# Altium footprint library Passive Pad Lib.PcbLib: 110 footprints (part 5 of 7)
Each footprint in its own frame and in the unit in brackets; x right, y up, seen from the top. Pads: shape width x height; smd on the part's side, far side on the other; paste and mask are expansions set on the pad; w line width, h text height; cw(c..) or ccw(c..) is an arc to the next point about the centre after c.
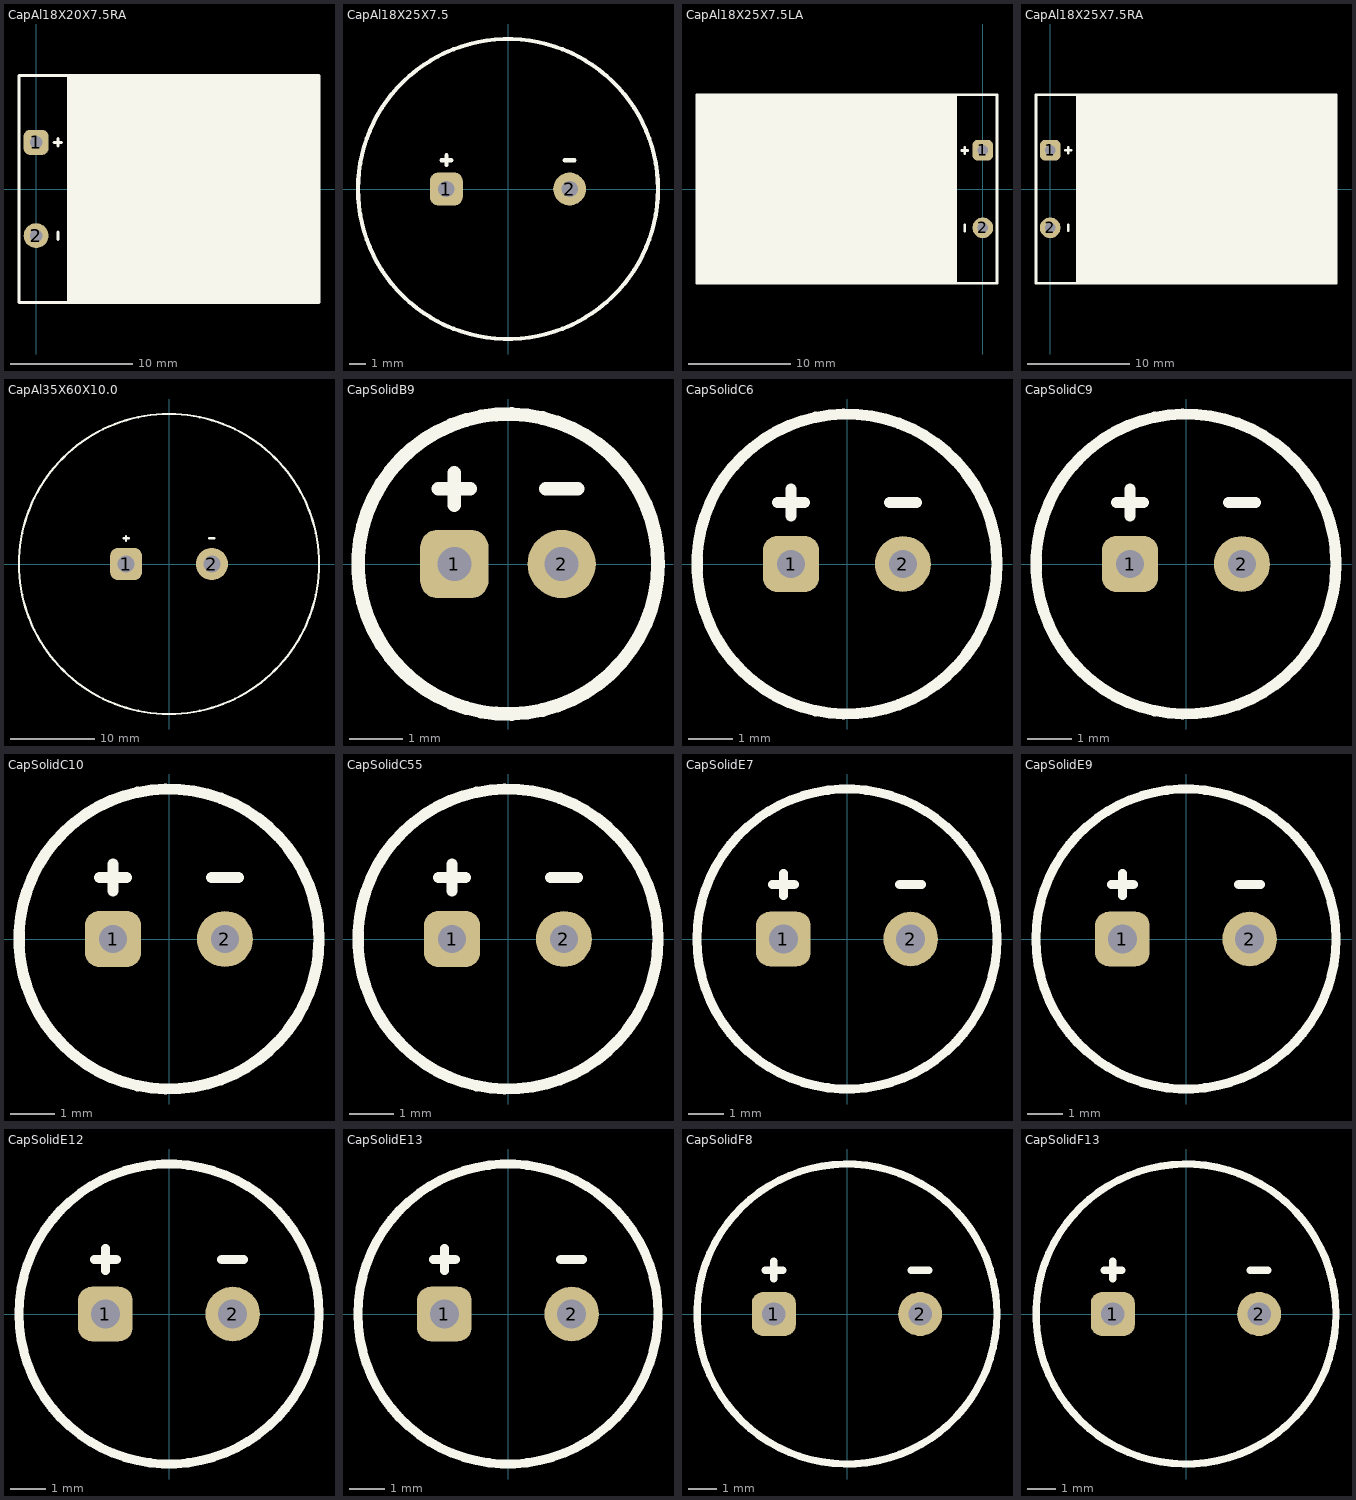
[diagram p4: the footprints below, top view; thin cyan lines are the x and y axes]

## CapAl18X20X7.5RA [mil] "Aluminum Electrolytic Capacitors (Size:18X20X7.5mm, Angled Right)"
pads (2):
  rrect50% 80x80 hole 40: 1(0,150)
  round 80 hole 40: 2(0,-150)
Top Overlay:
  region: 100,365 100,-365 910,-365 910,365
  lines w10: 58,150 82,150 ; 70,-162 70,-138 ; 70,138 70,162 ; -55,-365 -55,365 910,365 910,-365 -55,-365
3D body "THD Capacitor Polar 18x20x7.5mm RA.step": height 715.33, standoff -112.44, extent -16.09,-355.33 906.09,355.33

## CapAl18X25X7.5 [mil] "Aluminum Electrolytic Capacitors (Size:18X25X7.5mm,Straight)"
pads (2):
  rrect50% 80x80 hole 40: 1(-150,0)
  round 80 hole 40: 2(150,0)
Top Overlay:
  circle w10: c0,0 r365
  lines w10: -162,70 -138,70 ; -150,58 -150,82 ; 138,70 162,70
3D body "THD Capacitor Polar 18x25x7.5mm.step": height 999.94, standoff -133.81, extent -355.33,-355.33 355.33,355.33

## CapAl18X25X7.5LA [mil] "Aluminum Electrolytic Capacitors (Size:18X25X7.5mm, Angled Left)"
pads (2):
  rrect50% 80x80 hole 40: 1(0,150)
  round 80 hole 40: 2(0,-150)
Top Overlay:
  region: -100,-365 -100,365 -1105,365 -1105,-365
  lines w10: -82,149 -58,149 ; -70,-163 -70,-139 ; -70,137 -70,161 ; -1105,-365 -1105,365 55,365 55,-365 -1105,-365
3D body "THD Capacitor Polar 18x25x7.5mm LA.step": height 715.33, standoff -112.44, extent -1102.93,-355.33 16.26,355.33

## CapAl18X25X7.5RA [mil] "Aluminum Electrolytic Capacitors (Size:18X25X7.5mm, Angled Right)"
pads (2):
  rrect50% 80x80 hole 40: 1(0,150)
  round 80 hole 40: 2(0,-150)
Top Overlay:
  region: 100,365 100,-365 1105,-365 1105,365
  lines w10: 58,150 82,150 ; 70,-162 70,-138 ; 70,138 70,162 ; -55,-365 1105,-365 1105,365 -55,365 -55,-365
3D body "THD Capacitor Polar 18x25x7.5mm RA.step": height 720.33, standoff -107.44, extent -16.09,-355.33 1102.94,355.33

## CapAl35X60X10.0 [mil] "Aluminum Electrolytic Capacitors (Size:35X60X10mm,Straight)"
pads (2):
  rrect50% 150x150 hole 80: 1(-200,0)
  round 150 hole 80: 2(200,0)
Top Overlay:
  circle w10: c0,0 r700
  lines w10: -212,120 -188,120 ; -200,108 -200,130 ; 188,120 212,120
3D body "THD Capacitor Polar 35x60x10mm.step": height 2421.26, standoff -196.85, extent -688.97,-688.97 688.98,688.98

## CapSolidB9 [mm] "Conductive Polymer Aluminum Solid Capacitors. Case B9  (Size:5X9X2.0mm,Straight)"
pads (2):
  rrect50% 1.27x1.27 hole 0.635: 1(-1,0)
  round 1.27 hole 0.635: 2(1,0)
Top Overlay:
  circle w0.254: c0,0 r2.794
  lines w0.254: -1.3,1.4 -0.7,1.4 ; -1,1.1 -1,1.7 ; 0.7,1.4 1.3,1.4
3D body "THD Capacitor Polar B9(5X9mm).STEP": height 9.06, standoff -2.6, extent -2.5,-2.5 2.5,2.5

## CapSolidC6 [mil] "Conductive Polymer Aluminum Solid Capacitors. Case C6 (Size:6.3X6X2.5mm,Straight)"
pads (2):
  rrect50% 50x50 hole 25: 1(-50,0)
  round 50 hole 25: 2(50,0)
Top Overlay:
  circle w10: c0,0 r134
  lines w10: -62,55 -38,55 ; -50,43 -50,67 ; 38,55 62,55
3D body "THD Capacitor Polar C6(6.3X6mm).STEP": height 237.61, standoff -103.33, extent -124.02,-124.02 124.01,124.01

## CapSolidC9 [mil] "Conductive Polymer Aluminum Solid Capacitors. Case C9 (Size:6.3X9X2.5mm,Straight)"
pads (2):
  rrect50% 50x50 hole 25: 1(-50,0)
  round 50 hole 25: 2(50,0)
Top Overlay:
  circle w10: c0,0 r134
  lines w10: -62,55 -38,55 ; -50,43 -50,67 ; 38,55 62,55
3D body "THD Capacitor Polar C9(6.3X9mm).STEP": height 355.72, standoff -103.33, extent -124.02,-124.02 124.01,124.01

## CapSolidC10 [mil] "Conductive Polymer Aluminum Solid Capacitors. Case C10  (Size:6.3X10X2.5mm,Straight)"
pads (2):
  rrect50% 50x50 hole 25: 1(-50,0)
  round 50 hole 25: 2(50,0)
Top Overlay:
  circle w10: c0,0 r134
  lines w10: -62,55 -38,55 ; -50,43 -50,67 ; 38,55 62,55
3D body "THD Capacitor Polar C10(6.3X10mm).STEP": height 396.09, standoff -102.33, extent -124.02,-124.02 124.01,124.01

## CapSolidC55 [mil] "Conductive Polymer Aluminum Solid Capacitors. Case C55 (Size:6.3X5.5X2.5mm,Straight)"
pads (2):
  rrect50% 50x50 hole 25: 1(-50,0)
  round 50 hole 25: 2(50,0)
Top Overlay:
  circle w10: c0,0 r134
  lines w10: -62,55 -38,55 ; -50,43 -50,67 ; 38,55 62,55
3D body "THD Capacitor Polar C55(6.3X5.5mm).STEP": height 217.93, standoff -103.33, extent -124.02,-124.02 124.01,124.01

## CapSolidE7 [mil] "Conductive Polymer Aluminum Solid Capacitors. Case E7 (Size:8X7X3.5mm,Straight)"
pads (2):
  rrect50% 60x60 hole 32: 1(-70,0)
  round 60 hole 32: 2(70,0)
Top Overlay:
  circle w10: c0,0 r165
  lines w10: -82,60 -58,60 ; -70,48 -70,72 ; 58,60 82,60
3D body "THD Capacitor Polar E7(8X7mm).STEP": height 276.98, standoff -103.33, extent -157.48,-157.48 157.48,157.48

## CapSolidE9 [mil] "Conductive Polymer Aluminum Solid Capacitors. Case E9 (Size:8X9X3.5mm,Straight)"
pads (2):
  rrect50% 60x60 hole 32: 1(-70,0)
  round 60 hole 32: 2(70,0)
Top Overlay:
  circle w10: c0,0 r165
  lines w10: -82,60 -58,60 ; -70,48 -70,72 ; 58,60 82,60
3D body "THD Capacitor Polar E9(8X9mm).STEP": height 355.72, standoff -103.33, extent -157.48,-157.48 157.48,157.48

## CapSolidE12 [mil] "Conductive Polymer Aluminum Solid Capacitors. Case E12 (Size:8X12X3.5mm,Straight)"
pads (2):
  rrect50% 60x60 hole 32: 1(-70,0)
  round 60 hole 32: 2(70,0)
Top Overlay:
  circle w10: c0,0 r165
  lines w10: -82,60 -58,60 ; -70,48 -70,72 ; 58,60 82,60
3D body "THD Capacitor Polar E12(8X12mm).STEP": height 473.83, standoff -103.33, extent -157.48,-157.48 157.48,157.48

## CapSolidE13 [mil] "Conductive Polymer Aluminum Solid Capacitors. Case E13 (Size:8X13X3.5mm,Straight)"
pads (2):
  rrect50% 60x60 hole 32: 1(-70,0)
  round 60 hole 32: 2(70,0)
Top Overlay:
  circle w10: c0,0 r165
  lines w10: -82,60 -58,60 ; -70,48 -70,72 ; 58,60 82,60
3D body "THD Capacitor Polar E13(8X13mm).STEP": height 513.2, standoff -103.33, extent -157.48,-157.48 157.48,157.48

## CapSolidF8 [mil] "Conductive Polymer Aluminum Solid Capacitors.  Case F8 (Size:10X8X5mm,Straight)"
pads (2):
  rrect50% 60x60 hole 32: 1(-100,0)
  round 60 hole 32: 2(100,0)
Top Overlay:
  circle w10: c0,0 r205
  lines w10: -112,60 -88,60 ; -100,48 -100,72 ; 88,60 112,60
3D body "THD Capacitor Polar F8(10X8mm).STEP": height 317.35, standoff -102.33, extent -196.85,-196.85 196.85,196.85

## CapSolidF13 [mil] "Conductive Polymer Aluminum Solid Capacitors.  Case F13 (Size:10X13X5mm,Straight)"
pads (2):
  rrect50% 60x60 hole 32: 1(-100,0)
  round 60 hole 32: 2(100,0)
Top Overlay:
  circle w10: c0,0 r205
  lines w10: -112,60 -88,60 ; -100,48 -100,72 ; 88,60 112,60
3D body "THD Capacitor Polar F13(10X13mm).STEP": height 514.2, standoff -102.33, extent -196.85,-196.85 196.85,196.85